# Altium footprint library Ports2.54.PcbLib: 152 footprints (part 9 of 10)
Each footprint in its own frame and in the unit in brackets; x right, y up, seen from the top. Pads: shape width x height; smd on the part's side, far side on the other; paste and mask are expansions set on the pad; w line width, h text height; cw(c..) or ccw(c..) is an arc to the next point about the centre after c.
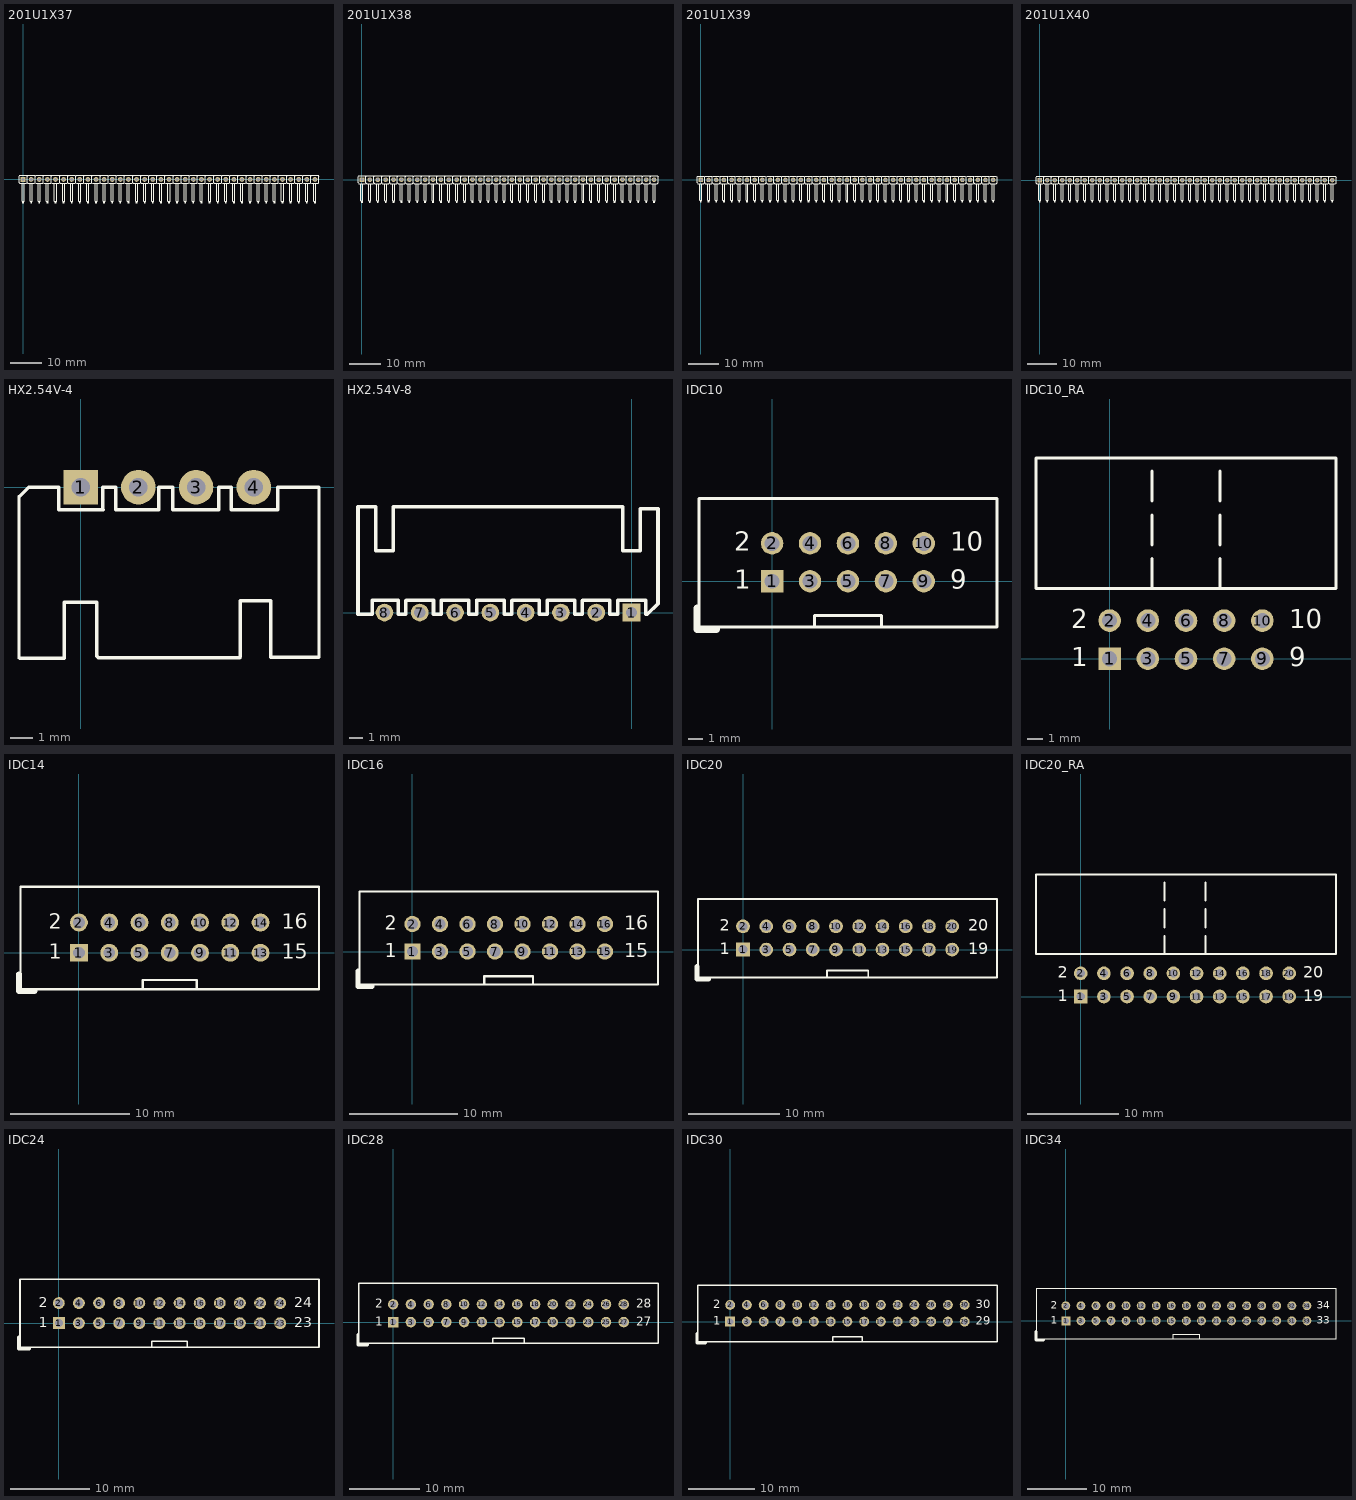
[diagram p8: the footprints below, top view; thin cyan lines are the x and y axes]

## 201U1X37 [mm]
pads (37):
  rect 1.5x1.5 hole 1: 1(0,0)
  round 1.5 hole 1: 2(2.54,0) 3(5.08,0) 4(7.62,0) 5(10.16,0) 6(12.7,0) 7(15.24,0) 8(17.78,0) 9(20.32,0) 10(22.86,0) 11(25.4,0) 12(27.94,0) 13(30.48,0) 14(33.02,0) 15(35.56,0) 16(38.1,0) 17(40.64,0) 18(43.18,0) 19(45.72,0) 20(48.26,0) 21(50.8,0) 22(53.34,0) 23(55.88,0) 24(58.42,0) 25(60.96,0) 26(63.5,0) 27(66.04,0) 28(68.58,0) 29(71.12,0) 30(73.66,0) 31(76.2,0) 32(78.74,0) 33(81.28,0) 34(83.82,0) 35(86.36,0) 36(88.9,0) 37(91.44,0)
Top Overlay:
  drawing of 482 lines, arcs and shapes, not listed
3D body "201U37.STEP": height 5.12, standoff -3, extent -1.27,-7.27 92.71,1.27

## 201U1X38 [mm]
pads (38):
  rect 1.5x1.5 hole 1: 1(0,0)
  round 1.5 hole 1: 2(2.54,0) 3(5.08,0) 4(7.62,0) 5(10.16,0) 6(12.7,0) 7(15.24,0) 8(17.78,0) 9(20.32,0) 10(22.86,0) 11(25.4,0) 12(27.94,0) 13(30.48,0) 14(33.02,0) 15(35.56,0) 16(38.1,0) 17(40.64,0) 18(43.18,0) 19(45.72,0) 20(48.26,0) 21(50.8,0) 22(53.34,0) 23(55.88,0) 24(58.42,0) 25(60.96,0) 26(63.5,0) 27(66.04,0) 28(68.58,0) 29(71.12,0) 30(73.66,0) 31(76.2,0) 32(78.74,0) 33(81.28,0) 34(83.82,0) 35(86.36,0) 36(88.9,0) 37(91.44,0) 38(93.98,0)
Top Overlay:
  drawing of 495 lines, arcs and shapes, not listed
3D body "201U38.STEP": height 5.12, standoff -3, extent -1.27,-7.27 95.25,1.27

## 201U1X39 [mm]
pads (39):
  rect 1.5x1.5 hole 1: 1(0,0)
  round 1.5 hole 1: 2(2.54,0) 3(5.08,0) 4(7.62,0) 5(10.16,0) 6(12.7,0) 7(15.24,0) 8(17.78,0) 9(20.32,0) 10(22.86,0) 11(25.4,0) 12(27.94,0) 13(30.48,0) 14(33.02,0) 15(35.56,0) 16(38.1,0) 17(40.64,0) 18(43.18,0) 19(45.72,0) 20(48.26,0) 21(50.8,0) 22(53.34,0) 23(55.88,0) 24(58.42,0) 25(60.96,0) 26(63.5,0) 27(66.04,0) 28(68.58,0) 29(71.12,0) 30(73.66,0) 31(76.2,0) 32(78.74,0) 33(81.28,0) 34(83.82,0) 35(86.36,0) 36(88.9,0) 37(91.44,0) 38(93.98,0) 39(96.52,0)
Top Overlay:
  drawing of 508 lines, arcs and shapes, not listed
3D body "201U39.STEP": height 5.12, standoff -3, extent -1.27,-7.27 97.79,1.27

## 201U1X40 [mm]
pads (40):
  rect 1.5x1.5 hole 1: 1(0,0)
  round 1.5 hole 1: 2(2.54,0) 3(5.08,0) 4(7.62,0) 5(10.16,0) 6(12.7,0) 7(15.24,0) 8(17.78,0) 9(20.32,0) 10(22.86,0) 11(25.4,0) 12(27.94,0) 13(30.48,0) 14(33.02,0) 15(35.56,0) 16(38.1,0) 17(40.64,0) 18(43.18,0) 19(45.72,0) 20(48.26,0) 21(50.8,0) 22(53.34,0) 23(55.88,0) 24(58.42,0) 25(60.96,0) 26(63.5,0) 27(66.04,0) 28(68.58,0) 29(71.12,0) 30(73.66,0) 31(76.2,0) 32(78.74,0) 33(81.28,0) 34(83.82,0) 35(86.36,0) 36(88.9,0) 37(91.44,0) 38(93.98,0) 39(96.52,0) 40(99.06,0)
Top Overlay:
  drawing of 521 lines, arcs and shapes, not listed
3D body "201U40.STEP": height 5.12, standoff -3, extent -1.27,-7.27 100.33,1.27

## HX2.54V-4 [mil]
pads (4):
  rect 60x60 hole 32: 1(0,0)
  round 60 hole 32: 2(100,0) 3(200,0) 4(300,0)
Top Overlay:
  lines w6.06: 26.14,-199.13 -28.11,-199.13 -28.11,-296.38 -105.91,-296.38 -106.93,-295.35 -106.93,-16.93 -103.07,-13.07 -90,0 -38.35,0 -38.35,-38.66 -37.8,-39.21 39.21,-39.21 38.66,-38.66 38.66,0 61.18,0 61.18,-39.45 134.65,-39.45 135.2,-38.9 135.2,0 ; 28.19,-199.13 28.19,-293.31 30.24,-295.35 275.91,-295.35 276.93,-294.33 276.93,-198.11 ; 135.67,0 159.21,0 ; 159.76,-39.21 159.76,0 ; 160.55,-39.21 238.82,-39.21 239.06,-38.98 239.06,0 260.55,0 ; 261.1,0 261.1,-39.45 341.97,-39.45 ; 276.93,-197.09 329.13,-197.09 329.61,-197.56 329.61,-294.88 413.07,-294.88 413.07,0 343.54,0 ; 341.97,-38.43 341.97,0
3D body "HDR2.54xV4.STEP": height 236.11, standoff -78.63, extent -105,-300 415,10.75

## HX2.54V-8 [mil]
pads (8):
  rect 50x50 hole 32: 1(0,0)
  round 50 hole 32: 2(-100,0) 3(-200,0) 4(-300,0) 5(-400,0) 6(-500,0) 7(-600,0) 8(-700,0)
Top Overlay:
  lines w10: -661.1,-5 -661.1,34.45 -735,34.45 -735,30 -735,-5 -775,-5 -775,300 -725,300 -725,175 -675,175 -675,300 -25,300 -25,175 25,175 25,294.67 75,294.67 75,25 45,-5 40,-5 40,35 -39.06,35 -39.06,-5 -60.55,-5 ; -660.55,-5 -639.06,-5 -639.06,33.98 -638.58,34.45 -561.1,34.45 -561.1,-5 ; -560.55,-5 -539.06,-5 -539.06,33.98 -538.58,34.45 -461.1,34.45 -461.1,-5 ; -460.55,-5 -439.06,-5 -439.06,33.98 -438.58,34.45 -361.1,34.45 -361.1,-5 ; -360.55,-5 -339.06,-5 -339.06,33.98 -338.58,34.45 -261.1,34.45 -261.1,-5 ; -260.55,-5 -239.06,-5 -239.06,33.98 -238.58,34.45 -161.1,34.45 -161.1,-5 ; -160.55,-5 -139.06,-5 -139.06,33.98 -138.58,34.45 -61.1,34.45 -61.1,-5
3D body "HDR2.54xV8.STEP": height 236.11, standoff -78.63, extent -775,-10.74 75,300

## IDC10 [mm]
pads (10):
  rect 1.5x1.5 hole 1: 1(0,0)
  round 1.5 hole 1: 2(0,2.54) 3(2.54,0) 4(2.54,2.54) 5(5.08,0) 6(5.08,2.54) 7(7.62,0) 8(7.62,2.54) 9(10.16,0) 10(10.16,2.54)
Top Overlay:
  lines w0.2: 2.83,-3.048 2.83,-2.286 7.33,-2.286 7.33,-3.048 ; -4.902,-3.048 15.062,-3.048 15.062,5.537 -4.902,5.537 -4.902,-3.048
  lines w0.5: -5.029,-1.803 -5.029,-3.226 -3.734,-3.226
  text "9" at 11.938,-0.508 h1.27
  text "10" at 11.938,2.032 h1.27
  text "1" at -2.54,-0.508 h1.27
  text "2" at -2.54,2.032 h1.27
3D body "User Library-BH-10___64.step": height 9.19, standoff -2.95, extent -5.1,-3.123 15.26,6.077

## IDC10_RA [mm] "Right angle"
pads (10):
  rect 1.5x1.5 hole 1: 1(0,0)
  round 1.5 hole 1: 2(0,2.54) 3(2.54,0) 4(2.54,2.54) 5(5.08,0) 6(5.08,2.54) 7(7.62,0) 8(7.62,2.54) 9(10.16,0) 10(10.16,2.54)
Top Overlay:
  lines w0.2: 2.83,4.66 2.83,6.66 ; 2.83,4.826 2.83,5.588 ; 2.83,7.581 2.83,9.581 ; 2.83,10.502 2.83,12.502 ; 7.33,4.66 7.33,6.66 ; 7.33,4.826 7.33,5.588 ; 7.33,7.581 7.33,9.581 ; 7.33,10.502 7.33,12.502 ; -4.902,4.66 15.062,4.66 15.062,13.36 -4.902,13.36 -4.902,4.66
  text "1" at -2.54,-0.508 h1.27
  text "2" at -2.54,2.032 h1.27
  text "9" at 11.938,-0.508 h1.27
  text "10" at 11.938,2.032 h1.27
3D body "User Library-SLS-010-R920-01.step": height 9.11, standoff -3, extent -5.1,-0.317 15.26,13.543

## IDC14 [mm]
pads (14):
  rect 1.5x1.5 hole 1: 1(0,0)
  round 1.5 hole 1: 2(0,2.54) 3(2.54,0) 4(2.54,2.54) 5(5.08,0) 6(5.08,2.54) 7(7.62,0) 8(7.62,2.54) 9(10.16,0) 10(10.16,2.54) 11(12.7,0) 12(12.7,2.54) 13(15.24,0) 14(15.24,2.54)
Top Overlay:
  lines w0.2: 5.37,-3.048 5.37,-2.286 9.87,-2.286 9.87,-3.048 ; -4.902,-3.048 -4.902,5.537 20.142,5.537 20.142,-3.048 -4.902,-3.048
  lines w0.5: -5.029,-1.803 -5.029,-3.226 -3.734,-3.226
  text "2" at -2.54,2.032 h1.27
  text "1" at -2.54,-0.508 h1.27
  text "16" at 17.018,2.032 h1.27
  text "15" at 17.018,-0.508 h1.27
3D body "User Library-SLS-014-S920-01.step": height 9.1, standoff -3.2, extent -5.1,-3.175 20.34,5.935

## IDC16 [mm]
pads (16):
  rect 1.5x1.5 hole 1: 1(0,0)
  round 1.5 hole 1: 2(0,2.54) 3(2.54,0) 4(2.54,2.54) 5(5.08,0) 6(5.08,2.54) 7(7.62,0) 8(7.62,2.54) 9(10.16,0) 10(10.16,2.54) 11(12.7,0) 12(12.7,2.54) 13(15.24,0) 14(15.24,2.54) 15(17.78,0) 16(17.78,2.54)
Top Overlay:
  lines w0.2: 6.64,-3.048 6.64,-2.286 11.14,-2.286 11.14,-3.048 ; -4.902,-3.048 22.682,-3.048 22.682,5.537 -4.902,5.537 -4.902,-3.048
  lines w0.5: -5.029,-1.803 -5.029,-3.226 -3.734,-3.226
  text "16" at 19.558,2.032 h1.27
  text "15" at 19.558,-0.508 h1.27
  text "1" at -2.54,-0.508 h1.27
  text "2" at -2.54,2.032 h1.27
3D body "User Library-SLS-016-S920-01.step": height 9.1, standoff -3.2, extent -5.1,-3.185 22.88,5.725

## IDC20 [mm]
pads (20):
  rect 1.5x1.5 hole 1: 1(0,0)
  round 1.5 hole 1: 2(0,2.54) 3(2.54,0) 4(2.54,2.54) 5(5.08,0) 6(5.08,2.54) 7(7.62,0) 8(7.62,2.54) 9(10.16,0) 10(10.16,2.54) 11(12.7,0) 12(12.7,2.54) 13(15.24,0) 14(15.24,2.54) 15(17.78,0) 16(17.78,2.54) 17(20.32,0) 18(20.32,2.54) 19(22.86,0) 20(22.86,2.54)
Top Overlay:
  lines w0.2: 9.18,-3.048 9.18,-2.286 13.68,-2.286 13.68,-3.048 ; -4.902,-3.048 -4.902,5.537 27.762,5.537 27.762,-3.048 -4.902,-3.048
  lines w0.5: -5.029,-1.803 -5.029,-3.226 -3.734,-3.226
  text "20" at 24.638,2.032 h1.27
  text "19" at 24.638,-0.508 h1.27
  text "2" at -2.54,2.032 h1.27
  text "1" at -2.54,-0.508 h1.27
3D body "SW3dPS-PinBox Connector_20Pin.STEP": height 10.9, standoff -3, extent -5.009,-3.181 27.991,5.619

## IDC20_RA [mm] "Right angle"
pads (20):
  rect 1.5x1.5 hole 0.9: 1(0,0)
  round 1.5 hole 0.9: 2(0,2.54) 3(2.54,0) 4(2.54,2.54) 5(5.08,0) 6(5.08,2.54) 7(7.62,0) 8(7.62,2.54) 9(10.16,0) 10(10.16,2.54) 11(12.7,0) 12(12.7,2.54) 13(15.24,0) 14(15.24,2.54) 15(17.78,0) 16(17.78,2.54) 17(20.32,0) 18(20.32,2.54) 19(22.86,0) 20(22.86,2.54)
Top Overlay:
  lines w0.2: 9.18,4.66 9.18,6.66 ; 9.18,7.581 9.18,9.581 ; 9.18,10.502 9.18,12.502 ; 13.68,4.66 13.68,6.66 ; 13.68,7.581 13.68,9.581 ; 13.68,10.502 13.68,12.502 ; -4.902,4.66 27.991,4.66 27.991,13.36 -4.902,13.36 -4.902,4.66
  text "2" at -2.54,2.032 h1.27
  text "1" at -2.54,-0.508 h1.27
  text "19" at 24.384,-0.508 h1.27
  text "20" at 24.384,2.032 h1.27
3D body "User Library-SLS-020-R920-01.step": height 9.11, standoff -3, extent -5.1,-0.317 27.96,13.543

## IDC24 [mm]
pads (24):
  rect 1.5x1.5 hole 1: 1(0,0)
  round 1.5 hole 1: 2(0,2.54) 3(2.54,0) 4(2.54,2.54) 5(5.08,0) 6(5.08,2.54) 7(7.62,0) 8(7.62,2.54) 9(10.16,0) 10(10.16,2.54) 11(12.7,0) 12(12.7,2.54) 13(15.24,0) 14(15.24,2.54) 15(17.78,0) 16(17.78,2.54) 17(20.32,0) 18(20.32,2.54) 19(22.86,0) 20(22.86,2.54) 21(25.4,0) 22(25.4,2.54) 23(27.94,0) 24(27.94,2.54)
Top Overlay:
  lines w0.2: 11.72,-3.048 11.72,-2.286 16.22,-2.286 16.22,-3.048 ; -4.902,-3.048 -4.902,5.537 32.842,5.537 32.842,-3.048 -4.902,-3.048
  lines w0.5: -5.029,-1.803 -5.029,-3.226 -3.734,-3.226
  text "2" at -2.54,2.032 h1.27
  text "1" at -2.54,-0.508 h1.27
  text "24" at 29.718,2.032 h1.27
  text "23" at 29.718,-0.508 h1.27
3D body "User Library-SLS-024-S920-01.step": height 9.1, standoff -3.2, extent -5.08,-3.185 33.06,5.725

## IDC28 [mm]
pads (28):
  rect 1.5x1.5 hole 1: 1(0,0)
  round 1.5 hole 1: 2(0,2.54) 3(2.54,0) 4(2.54,2.54) 5(5.08,0) 6(5.08,2.54) 7(7.62,0) 8(7.62,2.54) 9(10.16,0) 10(10.16,2.54) 11(12.7,0) 12(12.7,2.54) 13(15.24,0) 14(15.24,2.54) 15(17.78,0) 16(17.78,2.54) 17(20.32,0) 18(20.32,2.54) 19(22.86,0) 20(22.86,2.54) 21(25.4,0) 22(25.4,2.54) 23(27.94,0) 24(27.94,2.54) 25(30.48,0) 26(30.48,2.54) 27(33.02,0) 28(33.02,2.54)
Top Overlay:
  lines w0.2: 14.26,-3.048 14.26,-2.286 18.76,-2.286 18.76,-3.048 ; -4.902,-3.048 -4.902,5.537 37.922,5.537 37.922,-3.048 -4.902,-3.048
  lines w0.5: -5.029,-1.803 -5.029,-3.226 -3.734,-3.226
  text "2" at -2.54,2.032 h1.27
  text "1" at -2.54,-0.508 h1.27
  text "27" at 34.798,-0.508 h1.27
  text "28" at 34.798,2.032 h1.27

## IDC30 [mm]
pads (30):
  rect 1.5x1.5 hole 1: 1(0,0)
  round 1.5 hole 1: 2(0,2.54) 3(2.54,0) 4(2.54,2.54) 5(5.08,0) 6(5.08,2.54) 7(7.62,0) 8(7.62,2.54) 9(10.16,0) 10(10.16,2.54) 11(12.7,0) 12(12.7,2.54) 13(15.24,0) 14(15.24,2.54) 15(17.78,0) 16(17.78,2.54) 17(20.32,0) 18(20.32,2.54) 19(22.86,0) 20(22.86,2.54) 21(25.4,0) 22(25.4,2.54) 23(27.94,0) 24(27.94,2.54) 25(30.48,0) 26(30.48,2.54) 27(33.02,0) 28(33.02,2.54) 29(35.56,0) 30(35.56,2.54)
Top Overlay:
  lines w0.2: 15.53,-3.048 15.53,-2.286 20.03,-2.286 20.03,-3.048 ; -4.902,-3.048 40.462,-3.048 40.462,5.537 -4.902,5.537 -4.902,-3.048
  lines w0.5: -5.029,-1.803 -5.029,-3.226 -3.734,-3.226
  text "1" at -2.54,-0.508 h1.27
  text "2" at -2.54,2.032 h1.27
  text "29" at 37.211,-0.508 h1.27
  text "30" at 37.211,2.032 h1.27
3D body "User Library-SLS-030-S920-01.step": height 9.1, standoff -3.2, extent -5.08,-3.285 40.68,5.825

## IDC34 [mm]
pads (34):
  rect 1.5x1.5 hole 1: 1(0,0)
  round 1.5 hole 1: 2(0,2.54) 3(2.54,0) 4(2.54,2.54) 5(5.08,0) 6(5.08,2.54) 7(7.62,0) 8(7.62,2.54) 9(10.16,0) 10(10.16,2.54) 11(12.7,0) 12(12.7,2.54) 13(15.24,0) 14(15.24,2.54) 15(17.78,0) 16(17.78,2.54) 17(20.32,0) 18(20.32,2.54) 19(22.86,0) 20(22.86,2.54) 21(25.4,0) 22(25.4,2.54) 23(27.94,0) 24(27.94,2.54) 25(30.48,0) 26(30.48,2.54) 27(33.02,0) 28(33.02,2.54) 29(35.56,0) 30(35.56,2.54) 31(38.1,0) 32(38.1,2.54) 33(40.64,0) 34(40.64,2.54)
Top Overlay:
  lines w0.2: 18.07,-3.048 18.07,-2.286 22.57,-2.286 22.57,-3.048 ; -4.902,-3.048 -4.902,5.537 45.542,5.537 45.542,-3.048 -4.902,-3.048
  lines w0.5: -5.029,-1.803 -5.029,-3.226 -3.734,-3.226
  text "2" at -2.54,2.032 h1.27
  text "1" at -2.54,-0.508 h1.27
  text "33" at 42.291,-0.508 h1.27
  text "34" at 42.291,2.032 h1.27
3D body "User Library-SLS-034-S920-01.step": height 9.1, standoff -3.2, extent -5.08,-3.285 45.76,5.825